# Altium footprint library Toi Library.PcbLib: 740 footprints (part 1 of 47)
Each footprint in its own frame and in the unit in brackets; x right, y up, seen from the top. Pads: shape width x height; smd on the part's side, far side on the other; paste and mask are expansions set on the pad; w line width, h text height; cw(c..) or ccw(c..) is an arc to the next point about the centre after c.
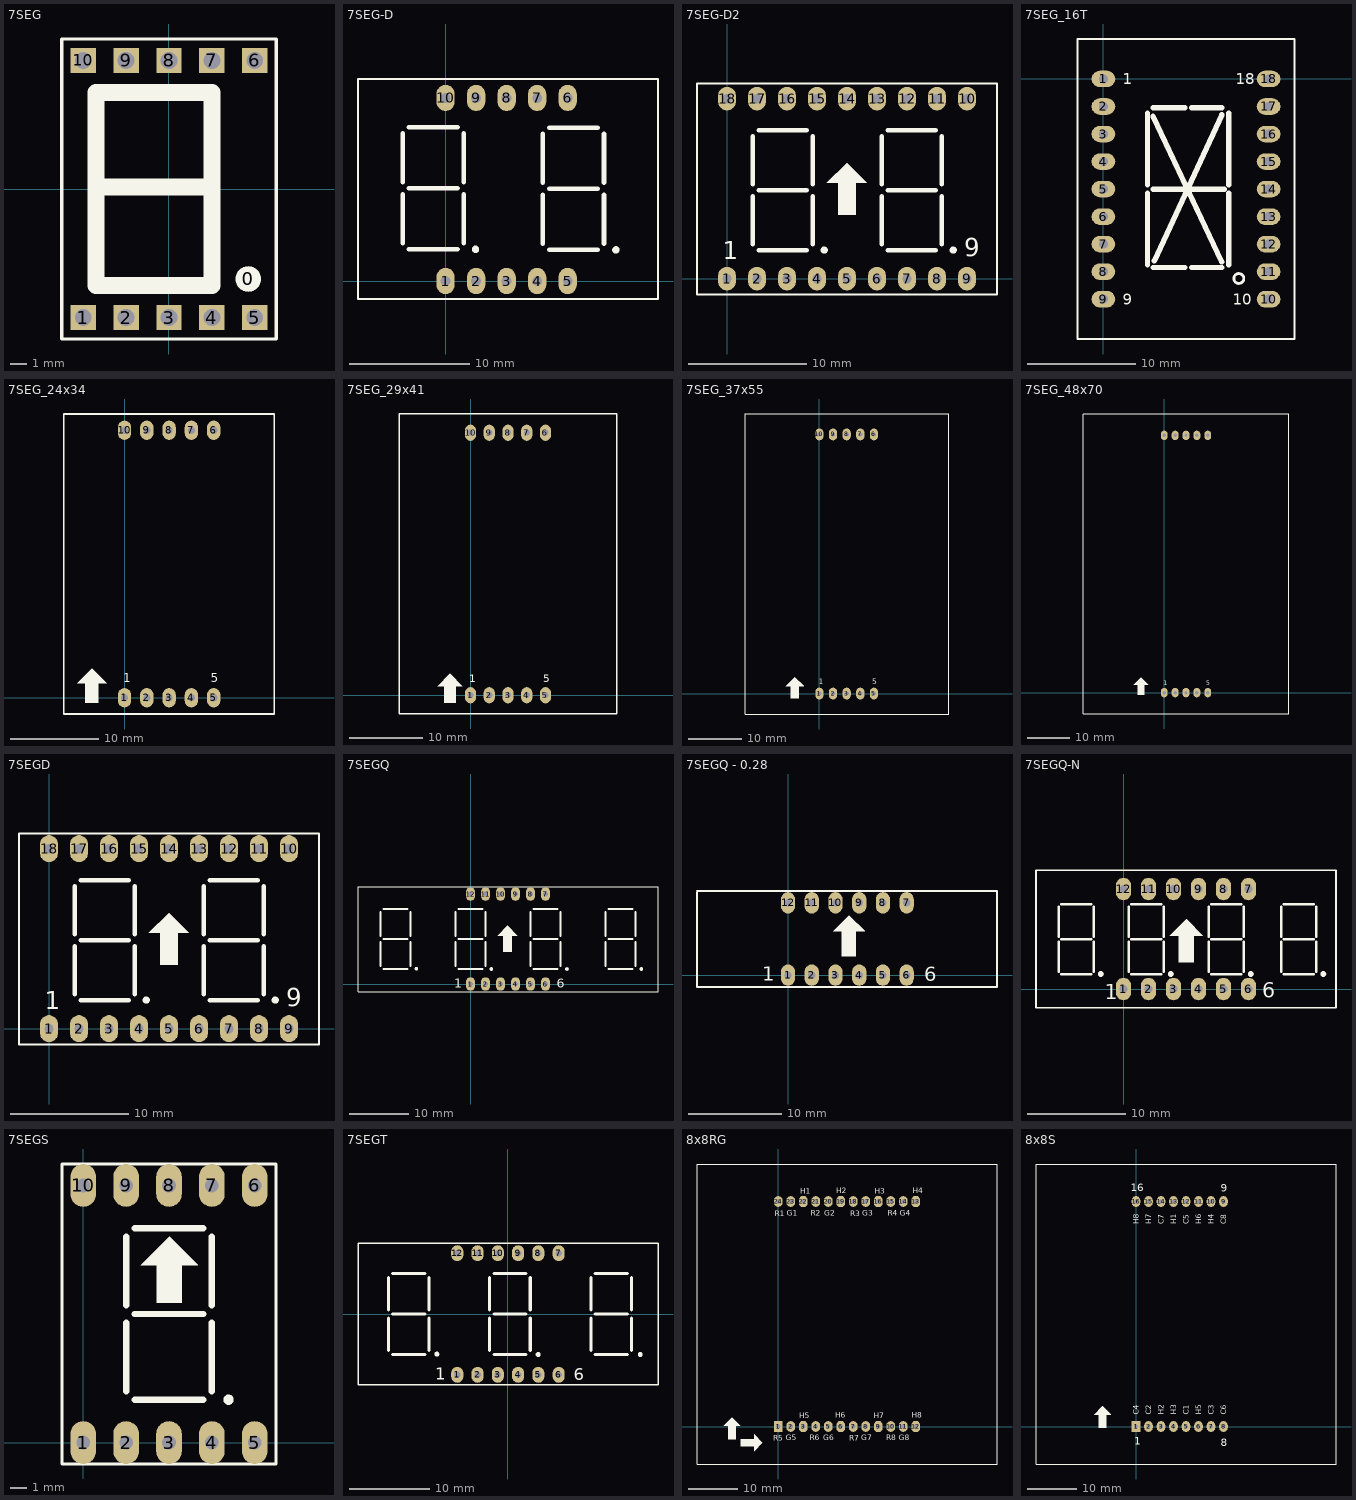
[diagram p0: the footprints below, top view; thin cyan lines are the x and y axes]

## 7SEG [mm] "7SEG"
pads (11):
  round 1.524 on Top Overlay: 0(4.724,-5.334)
  rect 1.5x1.5 hole 1: 1(-5.055,-7.62) 2(-2.515,-7.62) 3(0.025,-7.62) 4(2.565,-7.62) 5(5.105,-7.62) 6(5.105,7.62) 7(2.565,7.62) 8(0.025,7.62) 9(-2.515,7.62) 10(-5.055,7.62)
Top Overlay:
  lines w0.2: -6.325,-8.89 -6.325,8.89 6.375,8.89 6.375,-8.89 -6.325,-8.89
  lines w1: -4.166,0.127 2.565,0.127 ; -4.293,-5.715 2.565,-5.715 2.565,5.715 -4.293,5.715 -4.293,-5.715
3D body "SW3DPS-7SEGMENT DISPLAY.STEP": height 8.03, standoff -3.97, extent -6.35,-9.525 6.35,9.525

## 7SEG-D [mil] "DIP 10 Leads; Body 25 x 19 mm; Pitch 0.5 mm"
height 300
pads (10):
  oval 60x86 hole 32: 1(0,0) 2(100,0) 3(200,0) 4(300,0) 5(400,0) 6(400,600) 7(300,600) 8(200,600) 9(100,600) 10(0,600)
Top Overlay:
  circle w12: c558,102 r6
  circle w12: c98,104 r6
  lines w7: -287,-59 696,-59 696,662 -287,662 -287,-59
  lines w15: -141,124 -141,284 ; -141,124 -141,284 ; -141,124 -141,284 ; -141,124 -141,284 ; -141,124 -141,284 ; -141,124 -141,284 ; -141,124 -141,284 ; -141,124 -141,284 ; -141,324 -141,484 ; -141,324 -141,484 ; -141,324 -141,484 ; -141,324 -141,484 ; -141,324 -141,484 ; -141,324 -141,484 ; -141,324 -141,484 ; -141,324 -141,484 ; -121,104 39,104 ; -121,104 39,104 ; -121,104 39,104 ; -121,104 39,104 ; -121,304 39,304 ; -121,304 39,304 ; -121,304 39,304 ; -121,304 39,304 ; -121,304 39,304 ; -121,304 39,304 ; -121,304 39,304 ; -121,304 39,304 ; -121,504 39,504 ; -121,504 39,504 ; -121,504 39,504 ; -121,504 39,504 ; 59,124 59,284 ; 59,124 59,284 ; 59,124 59,284 ; 59,124 59,284 ; 59,124 59,284 ; 59,124 59,284 ; 59,124 59,284 ; 59,124 59,284 ; 59,324 59,484 ; 59,324 59,484 ; 59,324 59,484 ; 59,324 59,484 ; 59,324 59,484 ; 59,324 59,484 ; 59,324 59,484 ; 59,324 59,484 ; 319,122 319,282 ; 319,122 319,282 ; 319,122 319,282 ; 319,122 319,282 ; 319,122 319,282 ; 319,122 319,282 ; 319,122 319,282 ; 319,122 319,282 ; 319,322 319,482 ; 319,322 319,482 ; 319,322 319,482 ; 319,322 319,482 ; 319,322 319,482 ; 319,322 319,482 ; 319,322 319,482 ; 319,322 319,482 ; 339,102 499,102 ; 339,102 499,102 ; 339,102 499,102 ; 339,102 499,102 ; 339,302 499,302 ; 339,302 499,302 ; 339,302 499,302 ; 339,302 499,302 ; 339,302 499,302 ; 339,302 499,302 ; 339,302 499,302 ; 339,302 499,302 ; 339,502 499,502 ; 339,502 499,502 ; 339,502 499,502 ; 339,502 499,502 ; 519,122 519,282 ; 519,122 519,282 ; 519,122 519,282 ; 519,122 519,282 ; 519,122 519,282 ; 519,122 519,282 ; 519,122 519,282 ; 519,122 519,282 ; 519,322 519,482 ; 519,322 519,482 ; 519,322 519,482 ; 519,322 519,482 ; 519,322 519,482 ; 519,322 519,482 ; 519,322 519,482 ; 519,322 519,482

## 7SEG-D2 [mm] "DIP 18Leads; Body 24 x 15 mm; Pitch 0.5 mm"
height 7.62
pads (18):
  oval 1.524x2 hole 0.8 paste-2539.97: 1(0,0) 2(2.54,0) 3(5.08,0) 5(10.16,0) 6(12.7,0) 7(15.24,0) 8(17.78,0) 9(20.32,0) 10(20.32,15.24) 11(17.78,15.24) 12(15.24,15.24) 13(12.7,15.24) 14(10.16,15.24) 15(7.62,15.24) 16(5.08,15.24) 17(2.54,15.24) 18(0,15.24)
  oval 1.524x2 hole 0.8: 4(7.62,0)
Top Overlay:
  circle w0.305: c8.23,2.413 r0.152
  circle w0.305: c19.152,2.413 r0.152
  region: 8.458,8.103 10.135,9.779 10.185,9.779 11.836,8.128 11.836,8.103 10.897,8.103 10.897,5.41 9.398,5.41 9.398,8.103
  lines w0.178: -2.54,-1.333 -2.54,16.51 ; -2.54,-1.333 -2.54,16.51 ; -2.54,-1.333 -2.54,16.51 ; -2.54,-1.333 -2.54,16.51 ; -2.54,16.51 22.86,16.51 ; -2.54,16.51 22.86,16.51 ; -2.54,16.51 22.86,16.51 ; -2.54,16.51 22.86,16.51 ; 22.86,-1.333 22.86,16.51 ; 22.86,-1.333 22.86,16.51 ; 22.86,-1.333 -2.54,-1.321 22.86,-1.333 ; 22.86,-1.333 22.86,16.51 ; 22.86,-1.333 22.86,16.51
  lines w0.381: 2.159,2.921 2.159,6.985 ; 2.159,2.921 2.159,6.985 ; 2.159,2.921 2.159,6.985 ; 2.159,2.921 2.159,6.985 ; 2.159,2.921 2.159,6.985 ; 2.159,2.921 2.159,6.985 ; 2.159,2.921 2.159,6.985 ; 2.159,2.921 2.159,6.985 ; 2.159,8.001 2.159,12.065 ; 2.159,8.001 2.159,12.065 ; 2.159,8.001 2.159,12.065 ; 2.159,8.001 2.159,12.065 ; 2.159,8.001 2.159,12.065 ; 2.159,8.001 2.159,12.065 ; 2.159,8.001 2.159,12.065 ; 2.159,8.001 2.159,12.065 ; 2.667,2.413 6.731,2.413 ; 2.667,2.413 6.731,2.413 ; 2.667,2.413 6.731,2.413 ; 2.667,2.413 6.731,2.413 ; 2.667,7.493 6.731,7.493 ; 2.667,7.493 6.731,7.493 ; 2.667,7.493 6.731,7.493 ; 2.667,7.493 6.731,7.493 ; 2.667,7.493 6.731,7.493 ; 2.667,7.493 6.731,7.493 ; 2.667,7.493 6.731,7.493 ; 2.667,7.493 6.731,7.493 ; 2.667,12.573 6.731,12.573 ; 2.667,12.573 6.731,12.573 ; 2.667,12.573 6.731,12.573 ; 2.667,12.573 6.731,12.573 ; 7.239,2.921 7.239,6.985 ; 7.239,2.921 7.239,6.985 ; 7.239,2.921 7.239,6.985 ; 7.239,2.921 7.239,6.985 ; 7.239,2.921 7.239,6.985 ; 7.239,2.921 7.239,6.985 ; 7.239,2.921 7.239,6.985 ; 7.239,2.921 7.239,6.985 ; 7.239,8.001 7.239,12.065 ; 7.239,8.001 7.239,12.065 ; 7.239,8.001 7.239,12.065 ; 7.239,8.001 7.239,12.065 ; 7.239,8.001 7.239,12.065 ; 7.239,8.001 7.239,12.065 ; 7.239,8.001 7.239,12.065 ; 7.239,8.001 7.239,12.065 ; 13.081,2.921 13.081,6.985 ; 13.081,2.921 13.081,6.985 ; 13.081,2.921 13.081,6.985 ; 13.081,2.921 13.081,6.985 ; 13.081,2.921 13.081,6.985 ; 13.081,2.921 13.081,6.985 ; 13.081,2.921 13.081,6.985 ; 13.081,2.921 13.081,6.985 ; 13.081,8.001 13.081,12.065 ; 13.081,8.001 13.081,12.065 ; 13.081,8.001 13.081,12.065 ; 13.081,8.001 13.081,12.065 ; 13.081,8.001 13.081,12.065 ; 13.081,8.001 13.081,12.065 ; 13.081,8.001 13.081,12.065 ; 13.081,8.001 13.081,12.065 ; 13.589,2.413 17.653,2.413 ; 13.589,2.413 17.653,2.413 ; 13.589,2.413 17.653,2.413 ; 13.589,2.413 17.653,2.413 ; 13.589,7.493 17.653,7.493 ; 13.589,7.493 17.653,7.493 ; 13.589,7.493 17.653,7.493 ; 13.589,7.493 17.653,7.493 ; 13.589,7.493 17.653,7.493 ; 13.589,7.493 17.653,7.493 ; 13.589,7.493 17.653,7.493 ; 13.589,7.493 17.653,7.493 ; 13.589,12.573 17.653,12.573 ; 13.589,12.573 17.653,12.573 ; 13.589,12.573 17.653,12.573 ; 13.589,12.573 17.653,12.573 ; 18.161,2.921 18.161,6.985 ; 18.161,2.921 18.161,6.985 ; 18.161,2.921 18.161,6.985 ; 18.161,2.921 18.161,6.985 ; 18.161,2.921 18.161,6.985 ; 18.161,2.921 18.161,6.985 ; 18.161,2.921 18.161,6.985 ; 18.161,2.921 18.161,6.985 ; 18.161,8.001 18.161,12.065 ; 18.161,8.001 18.161,12.065 ; 18.161,8.001 18.161,12.065 ; 18.161,8.001 18.161,12.065 ; 18.161,8.001 18.161,12.065 ; 18.161,8.001 18.161,12.065 ; 18.161,8.001 18.161,12.065 ; 18.161,8.001 18.161,12.065
  text "9" at 20.066,1.905 h1.52
  text "1" at -0.356,1.651 h1.52

## 7SEG_16T [mil] "DIP 10 Leads; Body 24 x 34 mm; Pitch 0.5 mm"
height 300
pads (18):
  oval 86x60 hole 32: 1(0,0) 2(0,-100) 3(0,-200) 4(0,-300) 5(0,-400) 6(0,-500) 7(0,-600) 8(0,-700) 9(0,-800) 10(600,-800) 11(600,-700) 12(600,-600) 13(600,-500) 14(600,-400) 15(600,-300) 16(600,-200) 17(600,-100) 18(600,0)
Top Overlay:
  circle w10: c491.97,-725 r18.03
  lines w7: -93.7,-944.88 693.7,-944.88 693.7,145.28 -93.7,145.28 -93.7,-940.55
  lines w19.68: 160,-675 160,-415 ; 160,-385 160,-125 ; 180,-685 295,-685 ; 180,-400 440,-400 ; 180,-135 430,-665 ; 180,-105 295,-105 ; 185,-660 430,-130 ; 320,-685 430,-685 ; 320,-105 430,-105 ; 455,-675 455,-415 ; 455,-385 455,-125
  text "9" at 70,-820 h40
  text "1" at 70,-20 h40
  text "10" at 470,-820 h40
  text "18" at 480,-20 h40

## 7SEG_24x34 [mil] "DIP 10 Leads; Body 24 x 34 mm; Pitch 0.5 mm"
height 300
pads (10):
  oval 60x86 hole 32: 1(0,0) 2(100,0) 3(200,0) 4(300,0) 5(400,0) 6(400,1200) 7(300,1200) 8(200,1200) 9(100,1200) 10(0,1200)
Top Overlay:
  region: -213,65 -147,131 -145,131 -80,66 -80,65 -117,65 -117,-23 -176,-23 -176,65
  lines w7: -273,-73 672,-73 672,1273 -273,1273 -273,-73
  text "1" at -6.66,69 h40
  text "5" at 386.67,69 h40

## 7SEG_29x41 [mil] "DIP 10 Leads; Body 29 x 41 mm; Pitch 0.5 mm"
height 300
pads (10):
  oval 60x86 hole 32: 1(0,0) 2(100,0) 3(200,0) 4(300,0) 5(400,0) 6(400,1400) 7(300,1400) 8(200,1400) 9(100,1400) 10(0,1400)
Top Overlay:
  region: -176,48 -110,114 -108,114 -43,49 -43,48 -80,48 -80,-40 -139,-40 -139,48
  lines w7: -380,-100 780,-100 780,1500 -380,1500 -380,-100
  text "5" at 387.67,69 h40
  text "1" at -5.66,69 h40

## 7SEG_37x55 [mil] "DIP 10 Leads; Body 29 x 41 mm; Pitch 0.5 mm"
height 300
pads (10):
  oval 60x86 hole 32: 1(0,0) 2(100,0) 3(200,0) 4(300,0) 5(400,0) 6(400,1900) 7(300,1900) 8(200,1900) 9(100,1900) 10(0,1900)
Top Overlay:
  region: -248,55 -182,121 -180,121 -115,56 -115,55 -152,55 -152,-33 -211,-33 -211,55
  lines w7: -545,-150 -545,2050 950,2050 950,-150 -545,-150
  text "1" at -5.66,67 h40
  text "5" at 387.67,67 h40

## 7SEG_48x70 [mm] "DIP 10 Leads; Body 47,76 x 70mm; Pitch 0.5 mm"
height 7.62
pads (10):
  oval 1.6x2.2 hole 0.813: 1(0,0) 2(2.54,0) 3(5.08,0) 4(7.62,0) 5(10.16,0) 6(10.16,60) 7(7.62,60) 8(5.08,60) 9(2.54,60) 10(0,60)
Top Overlay:
  region: -7.112,1.778 -5.436,3.454 -5.385,3.454 -3.734,1.803 -3.734,1.778 -4.674,1.778 -4.674,-0.457 -6.172,-0.457 -6.172,1.778
  lines w0.178: -18.92,65 29.08,65 ; -18.92,-5 29.08,-5 -18.92,-5
  lines w0.203: -18.923,-4.928 -18.923,64.999 ; 29.058,-4.928 29.058,64.999
  text "1" at -0.144,1.702 h1.02
  text "5" at 9.847,1.702 h1.02

## 7SEGD [mil] "DIP 18Leads; Body 24 x 15 mm; Pitch 0.5 mm"
height 300
pads (18):
  oval 60x90 hole 31 paste-99999: 1(0,0) 2(100,0) 3(200,0) 5(400,0) 6(500,0) 7(600,0) 8(700,0) 9(800,0) 10(800,600) 11(700,600) 12(600,600) 13(500,600) 14(400,600) 15(300,600) 16(200,600) 17(100,600) 18(0,600)
  oval 60x90 hole 31: 4(300,0)
Top Overlay:
  circle w12: c754,95 r6
  circle w12: c324,95 r6
  region: 333,319 399,385 401,385 466,320 466,319 429,319 429,213 370,213 370,319
  lines w7: -100,-52.5 -100,650 ; -100,-52.5 -100,650 ; -100,-52.5 -100,650 ; -100,-52.5 -100,650 ; -100,650 900,650 ; -100,650 900,650 ; -100,650 900,650 ; -100,650 900,650 ; 900,-52.5 -100,-52 900,-52.5 ; 900,-52.5 900,650 ; 900,-52.5 900,650 ; 900,-52.5 900,650 ; 900,-52.5 900,650
  lines w15: 85,115 85,275 ; 85,115 85,275 ; 85,115 85,275 ; 85,115 85,275 ; 85,115 85,275 ; 85,115 85,275 ; 85,115 85,275 ; 85,115 85,275 ; 85,315 85,475 ; 85,315 85,475 ; 85,315 85,475 ; 85,315 85,475 ; 85,315 85,475 ; 85,315 85,475 ; 85,315 85,475 ; 85,315 85,475 ; 105,95 265,95 ; 105,95 265,95 ; 105,95 265,95 ; 105,95 265,95 ; 105,295 265,295 ; 105,295 265,295 ; 105,295 265,295 ; 105,295 265,295 ; 105,295 265,295 ; 105,295 265,295 ; 105,295 265,295 ; 105,295 265,295 ; 105,495 265,495 ; 105,495 265,495 ; 105,495 265,495 ; 105,495 265,495 ; 285,115 285,275 ; 285,115 285,275 ; 285,115 285,275 ; 285,115 285,275 ; 285,115 285,275 ; 285,115 285,275 ; 285,115 285,275 ; 285,115 285,275 ; 285,315 285,475 ; 285,315 285,475 ; 285,315 285,475 ; 285,315 285,475 ; 285,315 285,475 ; 285,315 285,475 ; 285,315 285,475 ; 285,315 285,475 ; 515,115 515,275 ; 515,115 515,275 ; 515,115 515,275 ; 515,115 515,275 ; 515,115 515,275 ; 515,115 515,275 ; 515,115 515,275 ; 515,115 515,275 ; 515,315 515,475 ; 515,315 515,475 ; 515,315 515,475 ; 515,315 515,475 ; 515,315 515,475 ; 515,315 515,475 ; 515,315 515,475 ; 515,315 515,475 ; 535,95 695,95 ; 535,95 695,95 ; 535,95 695,95 ; 535,95 695,95 ; 535,295 695,295 ; 535,295 695,295 ; 535,295 695,295 ; 535,295 695,295 ; 535,295 695,295 ; 535,295 695,295 ; 535,295 695,295 ; 535,295 695,295 ; 535,495 695,495 ; 535,495 695,495 ; 535,495 695,495 ; 535,495 695,495 ; 715,115 715,275 ; 715,115 715,275 ; 715,115 715,275 ; 715,115 715,275 ; 715,115 715,275 ; 715,115 715,275 ; 715,115 715,275 ; 715,115 715,275 ; 715,315 715,475 ; 715,315 715,475 ; 715,315 715,475 ; 715,315 715,475 ; 715,315 715,475 ; 715,315 715,475 ; 715,315 715,475 ; 715,315 715,475
  text "1" at -14,65 h60
  text "9" at 790,75 h60
3D body "SW3dPS-atd-036ab.STEP": height 283.66, standoff -120, extent -24.88,30 864.88,585.12

## 7SEGQ [mil] "DIP 12 Leads; Body 48 x 20 mm; Pitch 0.5 mm"
height 300
pads (12):
  oval 60x90 hole 31: 1(0,0) 2(100,0) 3(200,0) 4(300,0) 5(400,0) 6(500,0) 7(500,600) 8(400,600) 9(300,600) 10(200,600) 11(100,600) 12(0,600)
Top Overlay:
  drawing of 155 lines, arcs and shapes, not listed
  text "1" at -108,-24 h60
  text "6" at 575,-26 h60
3D body "7seg2-4.STEP": height 564.96, standoff 112.2, extent -720.16,-80 1260.16,668.03
3D body "SOCKET6.stp": height 276.19, standoff -117.51, extent -50,-44.99 550,55.01
3D body "SOCKET6.stp": height 276.19, standoff -117.51, extent -50,550 550,650

## 7SEGQ - 0.28 [mil] "DIP 12 Leads; Body 48 x 20 mm; Pitch 0.5 mm"
height 300
pads (12):
  oval 60x90 hole 31: 1(0,0) 2(100,0) 3(200,0) 4(300,0) 5(400,0) 6(500,0) 7(500,304.72) 8(400,304.72) 9(300,304.72) 10(200,304.72) 11(100,304.72) 12(0,304.72)
Top Overlay:
  region: 189.91,184.98 255.91,250.98 257.91,250.98 322.91,185.98 322.91,184.98 285.91,184.98 285.91,78.98 226.91,78.98 226.91,184.98
  lines w7: -383.86,349.41 -383.86,-50 880.91,-50 ; -383.86,354.33 880.91,354.33 880.91,-48.23
  text "6" at 575,-26 h60
  text "1" at -108,-24 h60
3D body "User Library-7seg4digit_028.STEP": height 228.35, standoff -224.41, extent -378.94,-48.23 880.91,349.41

## 7SEGQ-N [mil] "DIP 12 Leads; Body 32x 15 mm; Pitch 0.5 mm"
height 300
pads (12):
  oval 60x90 hole 31: 1(0,0) 2(100,0) 3(200,0) 4(300,0) 5(400,0) 6(500,0) 7(500,400) 8(400,400) 9(300,400) 10(200,400) 11(100,400) 12(0,400)
Top Overlay:
  circle w12: c509,60 r6
  circle w12: c799,60 r6
  circle w12: c-91,60 r6
  circle w12: c189,60 r6
  region: 184,213 250,279 252,279 317,214 317,213 280,213 280,107 221,107 221,213
  lines w7: -350,-75 -350,475 850,475 850,-75 -350,-75
  lines w10: -260,70 -260,190 ; -260,210 -260,330 ; -250,60 -130,60 ; -250,340 -130,340 ; -120,70 -120,190 ; -120,210 -120,330 ; 20,70 20,190 ; 20,210 20,330 ; 30,60 150,60 ; 30,340 150,340 ; 160,70 160,190 ; 160,210 160,330 ; 340,70 340,190 ; 340,210 340,330 ; 350,60 470,60 ; 350,340 470,340 ; 480,70 480,190 ; 480,210 480,330 ; 630,70 630,190 ; 630,210 630,330 ; 640,60 760,60 ; 640,340 760,340 ; 770,70 770,190 ; 770,210 770,330 ; -250,200 -130,200 -250,200 ; 30,200 150,200 30,200 ; 350,200 470,200 350,200 ; 640,200 760,200 640,200
  text "1" at -75,-40 h60
  text "6" at 555,-35 h60
3D body "SW3dPS-LTC-3710HR DISPLAY, 4-LED.STEP": height 238, standoff -98, extent -335.5,-70 865.5,450

## 7SEGS [mil] "DIP 10 Leads; Body 12 x 15 mm; Pitch 0.5 mm"
height 300
pads (10):
  oval 60x100 hole 32: 1(0,0) 2(100,0) 3(200,0) 4(300,0) 5(400,0) 6(400,600) 7(300,600) 8(200,600) 9(100,600) 10(0,600)
Top Overlay:
  circle w12: c339,100 r6
  region: 134,414 200,480 202,480 267,415 267,414 230,414 230,326 171,326 171,414
  lines w7: -50,-50 -50,650 450,650 450,-50 -50,-50
  lines w15: 100,120 100,280 ; 100,120 100,280 ; 100,120 100,280 ; 100,120 100,280 ; 100,120 100,280 ; 100,120 100,280 ; 100,120 100,280 ; 100,120 100,280 ; 100,320 100,480 ; 100,320 100,480 ; 100,320 100,480 ; 100,320 100,480 ; 100,320 100,480 ; 100,320 100,480 ; 100,320 100,480 ; 100,320 100,480 ; 120,100 280,100 ; 120,100 280,100 ; 120,100 280,100 ; 120,100 280,100 ; 120,300 280,300 ; 120,300 280,300 ; 120,300 280,300 ; 120,300 280,300 ; 120,300 280,300 ; 120,300 280,300 ; 120,300 280,300 ; 120,300 280,300 ; 120,500 280,500 ; 120,500 280,500 ; 120,500 280,500 ; 120,500 280,500 ; 300,120 300,280 ; 300,120 300,280 ; 300,120 300,280 ; 300,120 300,280 ; 300,120 300,280 ; 300,120 300,280 ; 300,120 300,280 ; 300,120 300,280 ; 300,320 300,480 ; 300,320 300,480 ; 300,320 300,480 ; 300,320 300,480 ; 300,320 300,480 ; 300,320 300,480 ; 300,320 300,480 ; 300,320 300,480
3D body "SW3dPS-Disp_SA56-11.STEP": height 316.25, standoff -156.19, extent -50,-75 450,675

## 7SEGT [mm] "DIP 12 Leads; Body 48 x 20 mm; Pitch 0.5 mm"
height 7.62
pads (12):
  oval 1.524x2 hole 0.8: 1(-6.35,-7.62) 2(-3.81,-7.62) 3(-1.27,-7.62) 4(1.27,-7.62) 5(3.81,-7.62) 6(6.35,-7.62) 7(6.35,7.62) 8(3.81,7.62) 9(1.27,7.62) 10(-1.27,7.62) 11(-3.81,7.62) 12(-6.35,7.62)
Top Overlay:
  circle w0.305: c16.586,-5.08 r0.152
  circle w0.305: c3.785,-5.08 r0.152
  circle w0.305: c-8.915,-5.029 r0.152
  lines w0.178: -18.796,-8.89 -18.796,8.89 18.804,8.89 18.804,-8.89 -18.796,-8.89
  lines w0.381: -14.986,-4.572 -14.986,-0.508 ; -14.986,-4.572 -14.986,-0.508 ; -14.986,-4.572 -14.986,-0.508 ; -14.986,-4.572 -14.986,-0.508 ; -14.986,0.508 -14.986,4.572 ; -14.986,0.508 -14.986,4.572 ; -14.986,0.508 -14.986,4.572 ; -14.986,0.508 -14.986,4.572 ; -14.478,0 -10.414,0 ; -14.478,0 -10.414,0 ; -14.478,0 -10.414,0 ; -14.478,0 -10.414,0 ; -9.906,-4.572 -9.906,-0.508 ; -9.906,-4.572 -9.906,-0.508 ; -9.906,-4.572 -9.906,-0.508 ; -9.906,-4.572 -9.906,-0.508 ; -9.906,0.508 -9.906,4.572 ; -9.906,0.508 -9.906,4.572 ; -9.906,0.508 -9.906,4.572 ; -9.906,0.508 -9.906,4.572 ; -2.286,-4.572 -2.286,-0.508 ; -2.286,-4.572 -2.286,-0.508 ; -2.286,-4.572 -2.286,-0.508 ; -2.286,-4.572 -2.286,-0.508 ; -2.286,0.508 -2.286,4.572 ; -2.286,0.508 -2.286,4.572 ; -2.286,0.508 -2.286,4.572 ; -2.286,0.508 -2.286,4.572 ; -1.778,0 2.286,0 ; -1.778,0 2.286,0 ; -1.778,0 2.286,0 ; -1.778,0 2.286,0 ; 2.794,-4.572 2.794,-0.508 ; 2.794,-4.572 2.794,-0.508 ; 2.794,-4.572 2.794,-0.508 ; 2.794,-4.572 2.794,-0.508 ; 2.794,0.508 2.794,4.572 ; 2.794,0.508 2.794,4.572 ; 2.794,0.508 2.794,4.572 ; 2.794,0.508 2.794,4.572 ; 10.414,-4.572 10.414,-0.508 ; 10.414,-4.572 10.414,-0.508 ; 10.414,-4.572 10.414,-0.508 ; 10.414,-4.572 10.414,-0.508 ; 10.414,-4.572 10.414,-0.508 ; 10.414,-4.572 10.414,-0.508 ; 10.414,-4.572 10.414,-0.508 ; 10.414,-4.572 10.414,-0.508 ; 10.414,0.508 10.414,4.572 ; 10.414,0.508 10.414,4.572 ; 10.414,0.508 10.414,4.572 ; 10.414,0.508 10.414,4.572 ; 10.414,0.508 10.414,4.572 ; 10.414,0.508 10.414,4.572 ; 10.414,0.508 10.414,4.572 ; 10.414,0.508 10.414,4.572 ; 10.922,-5.08 14.986,-5.08 ; 10.922,-5.08 14.986,-5.08 ; 10.922,-5.08 14.986,-5.08 ; 10.922,-5.08 14.986,-5.08 ; 10.922,0 14.986,0 ; 10.922,0 14.986,0 ; 10.922,0 14.986,0 ; 10.922,0 14.986,0 ; 10.922,0 14.986,0 ; 10.922,0 14.986,0 ; 10.922,0 14.986,0 ; 10.922,0 14.986,0 ; 10.922,5.08 14.986,5.08 ; 10.922,5.08 14.986,5.08 ; 10.922,5.08 14.986,5.08 ; 10.922,5.08 14.986,5.08 ; 15.494,-4.572 15.494,-0.508 ; 15.494,-4.572 15.494,-0.508 ; 15.494,-4.572 15.494,-0.508 ; 15.494,-4.572 15.494,-0.508 ; 15.494,-4.572 15.494,-0.508 ; 15.494,-4.572 15.494,-0.508 ; 15.494,-4.572 15.494,-0.508 ; 15.494,-4.572 15.494,-0.508 ; 15.494,0.508 15.494,4.572 ; 15.494,0.508 15.494,4.572 ; 15.494,0.508 15.494,4.572 ; 15.494,0.508 15.494,4.572 ; 15.494,0.508 15.494,4.572 ; 15.494,0.508 15.494,4.572 ; 15.494,0.508 15.494,4.572 ; 15.494,0.508 15.494,4.572 ; -14.478,-5.08 -10.414,-5.08 -14.478,-5.08 ; -14.478,5.08 -10.414,5.08 -14.478,5.08 ; -1.778,-5.08 2.286,-5.08 -1.778,-5.08 ; -1.778,5.08 2.286,5.08 -1.778,5.08
  text "6" at 8.255,-8.28 h1.52
  text "1" at -9.093,-8.23 h1.52

## 8x8RG [mil] "Matran 8x8 2mau,Body 60 X 60mm"
height 300
pads (24):
  rect 70x85 hole 37.4: 1(0,0)
  oval 70x85 hole 37.4: 2(100,0) 4(300,0) 5(400,0) 7(600,0) 8(700,0) 10(900,0) 11(1000,0) 14(1000,1800) 15(900,1800) 17(700,1800) 18(600,1800) 20(400,1800) 21(300,1800) 23(100,1800) 24(0,1800)
  oct 70x85 hole 37.4: 3(200,0) 6(500,0) 9(800,0) 12(1100,0) 13(1100,1800) 16(800,1800) 19(500,1800) 22(200,1800)
Top Overlay:
  region: -437,5 -371,71 -369,71 -304,6 -304,5 -341,5 -341,-101 -400,-101 -400,5
  region: -193,-63 -127,-129 -127,-131 -192,-196 -193,-196 -193,-159 -299,-159 -299,-100 -193,-100
  lines w7: -650,-300 1750,-300 ; -650,-300 -650,2100 ; -650,-300 -650,2100 ; -650,2100 1750,2100 ; 1750,-300 1750,2100 ; 1750,-300 1750,2100
  text "R8" at 863,-111 h45
  text "G8" at 962,-110 h45
  text "H8" at 1068,69 h45
  text "R7" at 568,-112 h45
  text "G7" at 664,-111 h45
  text "H7" at 765,68 h45
  text "R6" at 250,-111 h45
  text "G6" at 358,-111 h45
  text "H6" at 456,69 h45
  text "H5" at 166,68 h45
  text "G5" at 60,-111 h45
  text "R5" at -40,-112 h45
  text "R1" at -28,1684 h45
  text "G1" at 68,1685 h45
  text "H1" at 174,1864 h45
  text "H2" at 464,1865 h45
  text "G2" at 366,1685 h45
  text "R2" at 258,1685 h45
  text "H3" at 773,1864 h45
  text "G3" at 672,1685 h45
  text "R3" at 576,1684 h45
  text "H4" at 1076,1865 h45
  text "G4" at 970,1686 h45
  text "R4" at 874,1685 h45
Bottom Overlay:
  text "R8" at 932,-111 h45
  text "G8" at 1031,-110 h45
  text "H8" at 1137,69 h45
  text "R7" at 637,-112 h45
  text "G7" at 733,-111 h45
  text "H7" at 834,68 h45
  text "R6" at 319,-111 h45
  text "G6" at 427,-111 h45
  text "H6" at 525,69 h45
  text "H5" at 235,68 h45
  text "G5" at 129,-111 h45
  text "R5" at 29,-112 h45
  text "R1" at 41,1684 h45
  text "G1" at 137,1685 h45
  text "H1" at 243,1864 h45
  text "H2" at 533,1865 h45
  text "G2" at 435,1685 h45
  text "R2" at 327,1685 h45
  text "H3" at 842,1864 h45
  text "G3" at 741,1685 h45
  text "R3" at 645,1684 h45
  text "H4" at 1145,1865 h45
  text "G4" at 1039,1686 h45
  text "R4" at 943,1685 h45

## 8x8S [mil] "Matran 8x8, Body 60 X 60mm"
height 300
pads (16):
  rect 70x85 hole 31: 1(0,0)
  oval 70x85 hole 31: 2(100,0) 3(200,0) 4(300,0) 5(400,0) 6(500,0) 7(600,0) 8(700,0) 9(700,1800) 10(600,1800) 11(500,1800) 12(400,1800) 13(300,1800) 14(200,1800) 15(100,1800) 16(0,1800)
Top Overlay:
  region: -336,96 -270,162 -268,162 -203,97 -203,96 -240,96 -240,-10 -299,-10 -299,96
  lines w7: -800,-300 -800,2100 ; -800,-300 -800,2100 ; -800,-300 1600,-300 ; -800,-300 1600,-300 ; -800,2100 1600,2100 ; -800,2100 1600,2100 ; 1600,-300 1600,2100 ; 1600,-300 1600,2100
  text "H1" at 322.49,1620 h45
  text "H2" at 222.49,96 h45
  text "H3" at 322.49,96 h45
  text "H4" at 622.49,1620 h45
  text "16" at -42,1881 h60
  text "9" at 679,1880 h60
  text "8" at 678,-156 h60
  text "1" at -15,-144 h60
  text "C4" at 22.49,96 h45
  text "C3" at 622.49,96 h45
  text "C2" at 122.49,96 h45
  text "C1" at 422.49,96 h45
  text "C5" at 422.49,1620 h45
  text "H5" at 522.49,96 h45
  text "H6" at 522.49,1620 h45
  text "C6" at 722.49,96 h45
  text "H7" at 122.49,1620 h45
  text "C7" at 222.49,1620 h45
  text "H8" at 22.49,1620 h45
  text "C8" at 722.49,1620 h45